# Altium footprint library lib_protel_HC_BOINA.PCBLIB: 726 footprints (part 33 of 46)
Each footprint in its own frame and in the unit in brackets; x right, y up, seen from the top. Pads: shape width x height; smd on the part's side, far side on the other; paste and mask are expansions set on the pad; w line width, h text height; cw(c..) or ccw(c..) is an arc to the next point about the centre after c.
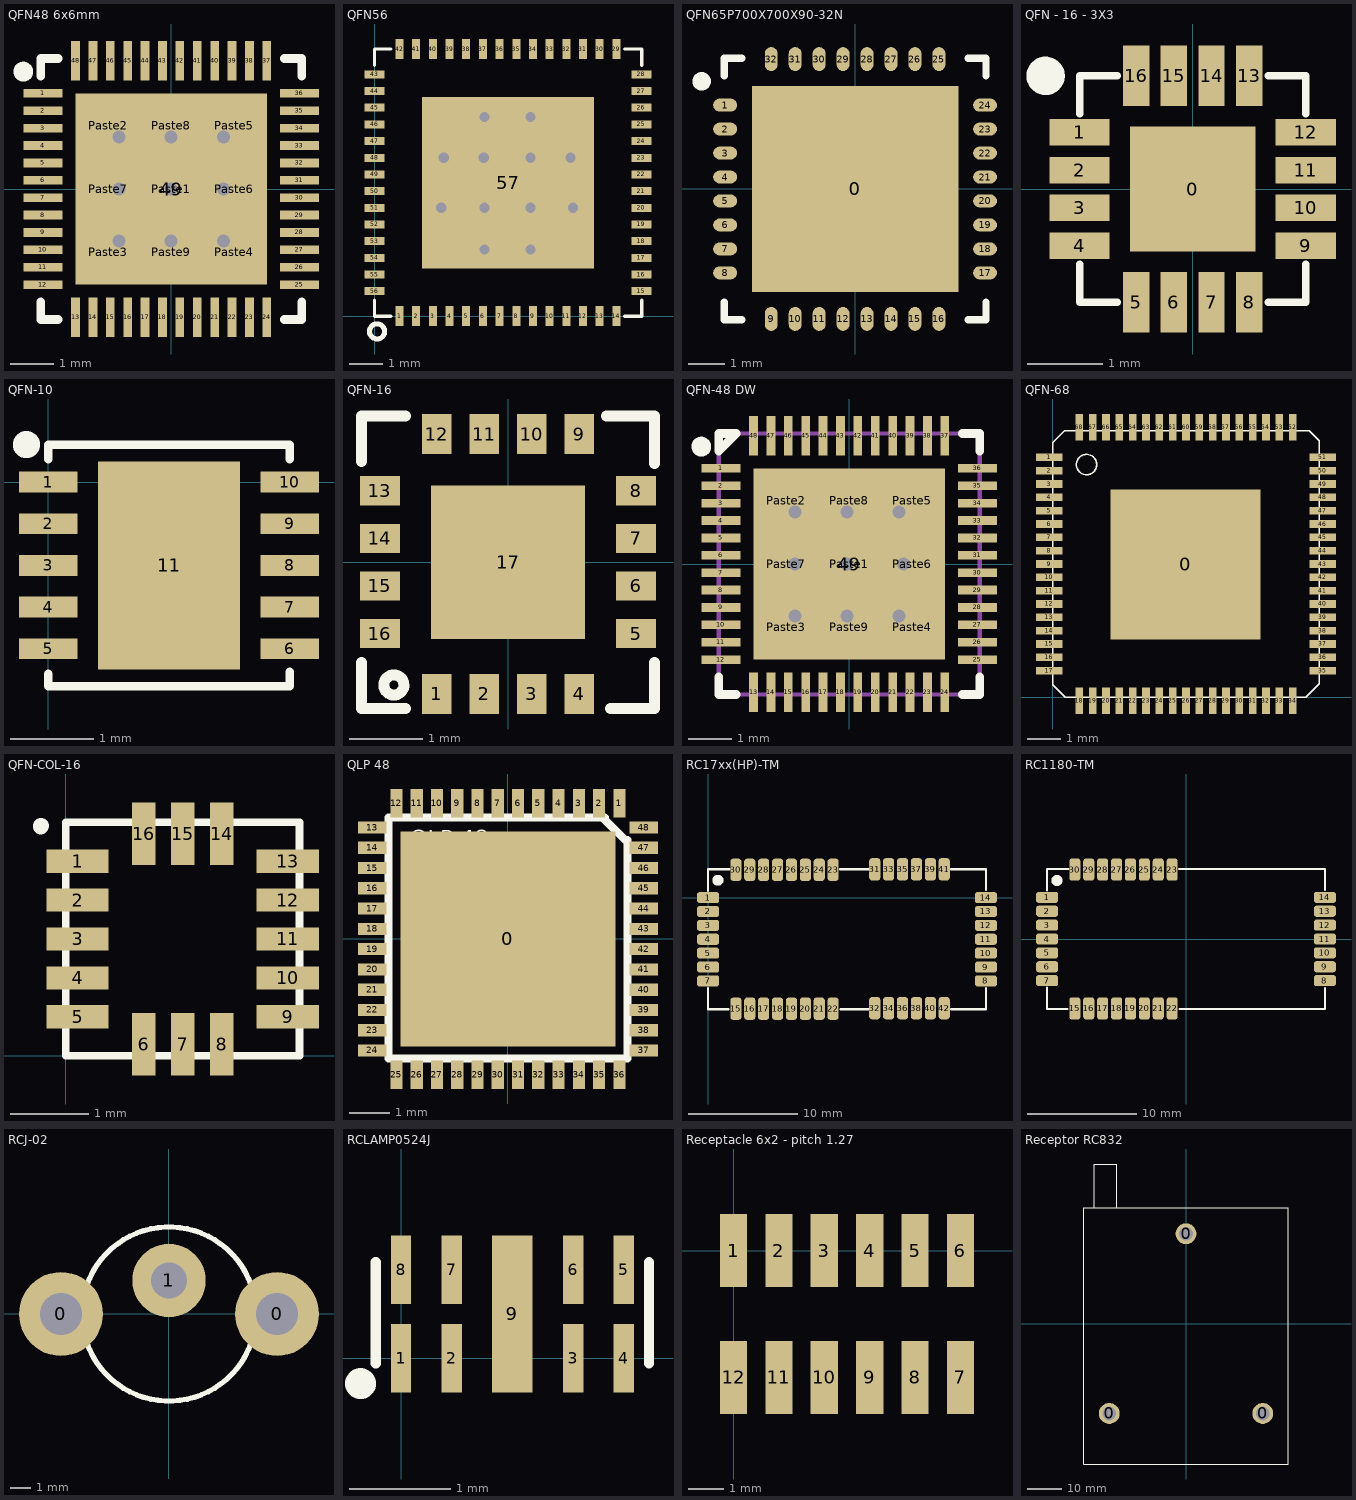
[diagram p32: the footprints below, top view; thin cyan lines are the x and y axes]

## QFN48 6x6mm [mm]
pads (58):
  rect 0.9x0.2 smd mask+0.05: 1(-2.95,2.2) 2(-2.95,1.8) 3(-2.95,1.4) 4(-2.95,1) 5(-2.95,0.6) 6(-2.95,0.2) 7(-2.95,-0.2) 8(-2.95,-0.6) 9(-2.95,-1) 10(-2.95,-1.4) 11(-2.95,-1.8) 12(-2.95,-2.2) 25(2.95,-2.2) 26(2.95,-1.8) 27(2.95,-1.4) 28(2.95,-1) 29(2.95,-0.6) 30(2.95,-0.2) 31(2.95,0.2) 32(2.95,0.6) 33(2.95,1) 34(2.95,1.4) 35(2.95,1.8) 36(2.95,2.2)
  rect 0.2x0.9 smd mask+0.05: 13(-2.2,-2.95) 14(-1.8,-2.95) 15(-1.4,-2.95) 16(-1,-2.95) 17(-0.6,-2.95) 18(-0.2,-2.95) 19(0.2,-2.95) 20(0.6,-2.95) 21(1,-2.95) 22(1.4,-2.95) 23(1.8,-2.95) 24(2.2,-2.95) 37(2.2,2.95) 38(1.8,2.95) 39(1.4,2.95) 40(1,2.95) 41(0.6,2.95) 42(0.2,2.95) 43(-0.2,2.95) 44(-0.6,2.95) 45(-1,2.95) 46(-1.4,2.95) 47(-1.8,2.95) 48(-2.2,2.95)
  rect 4.4x4.4 smd paste-4.4 mask+0.05: 49(0,0)
  rect 1.3x1.3 on Top Paste mask+0.05: Paste1(0,0) Paste2(-1.45,1.45) Paste3(-1.45,-1.45) Paste4(1.45,-1.45) Paste5(1.45,1.45) Paste6(1.45,0) Paste7(-1.45,0) Paste8(0,1.45) Paste9(0,-1.45)
via 1.2,1.2 diameter 0.6 hole 0.3
via -1.2,1.2 diameter 0.6 hole 0.3
via 1.2,-1.2 diameter 0.6 hole 0.3
via 0,-1.2 diameter 0.6 hole 0.3
via -1.2,-1.2 diameter 0.6 hole 0.3
via -1.2,0 diameter 0.6 hole 0.3
via 1.2,0 diameter 0.6 hole 0.3
via 0,0 diameter 0.6 hole 0.3
via 0,1.2 diameter 0.6 hole 0.3
Top Overlay:
  circle w0.254: c-3.4,2.7 r0.1
  lines w0.2: -3,-2.6 -3,-3 -2.6,-3 ; -3,2.6 -3,3 -2.6,3 ; 2.6,-3 3,-3 3,-2.6 ; 2.6,3 3,3 3,2.6
3D body: height 1, standoff 0, extent -3,-3 3,3

## QFN56 [mm] "encapsulado para SN75DP122ARTQ"
height 1
pads (57):
  rect 0.24x0.6 smd: 1(0.748,0) 2(1.248,0) 3(1.748,0) 4(2.248,0) 5(2.748,0) 6(3.248,0) 7(3.748,0) 8(4.248,0) 9(4.748,0) 10(5.248,0) 11(5.748,0) 12(6.248,0) 13(6.748,0) 14(7.248,0) 29(7.248,8.01) 30(6.748,8.01) 31(6.248,8.01) 32(5.748,8.01) 33(5.248,8.01) 34(4.748,8.01) 35(4.248,8.01) 36(3.748,8.01) 37(3.248,8.01) 38(2.748,8.01) 39(2.248,8.01) 40(1.748,8.01) 41(1.248,8.01) 42(0.748,8.01)
  rect 0.6x0.24 smd: 15(8,0.75) 16(8,1.25) 17(8,1.75) 18(8,2.25) 19(8,2.75) 20(8,3.25) 21(8,3.75) 22(8,4.25) 23(8,4.75) 24(8,5.25) 25(8,5.75) 26(8,6.25) 27(8,6.75) 28(8,7.25) 43(0,7.25) 44(0,6.75) 45(0,6.25) 46(0,5.75) 47(0,5.25) 48(0,4.75) 49(0,4.25) 50(0,3.75) 51(0,3.25) 52(0,2.75) 53(0,2.25) 54(0,1.75) 55(0,1.25) 56(0,0.75)
  rect 5.15x5.15 smd: 57(4,4)
via 2,3.25 diameter 0.61 hole 0.305
via 3.3,3.25 diameter 0.61 hole 0.305
via 4.675,3.25 diameter 0.61 hole 0.305
via 5.95,3.25 diameter 0.61 hole 0.305
via 4.675,2 diameter 0.61 hole 0.305
via 3.3,2 diameter 0.61 hole 0.305
via 3.275,4.75 diameter 0.61 hole 0.305
via 2.075,4.75 diameter 0.61 hole 0.305
via 4.675,4.75 diameter 0.61 hole 0.305
via 5.875,4.75 diameter 0.61 hole 0.305
via 3.3,5.975 diameter 0.61 hole 0.305
via 4.675,5.975 diameter 0.61 hole 0.305
Top Overlay:
  circle w0.152: c0.076,-0.456 r0.227
  lines w0.1: 0,0.483 0,0 0.482,0 ; 0,7.528 0,8.01 0.482,8.01 ; 7.502,0 8.01,0 8.01,0.483 ; 7.502,8.01 8.01,8.01 8.01,7.528

## QFN65P700X700X90-32N [mm] "QFN, 32-Leads, Body 7.1x7.1mm (max), Pitch 0.65mm, IPC Medium Density"
height 0.9
pads (33):
  rect 5.6x5.6 smd: 0(0,0)
  oval 0.65x0.35 smd: 1(-3.525,2.275) 2(-3.525,1.625) 3(-3.525,0.975) 4(-3.525,0.325) 5(-3.525,-0.325) 6(-3.525,-0.975) 7(-3.525,-1.625) 8(-3.525,-2.275) 17(3.525,-2.275) 18(3.525,-1.625) 19(3.525,-0.975) 20(3.525,-0.325) 21(3.525,0.325) 22(3.525,0.975) 23(3.525,1.625) 24(3.525,2.275)
  oval 0.35x0.65 smd: 9(-2.275,-3.525) 10(-1.625,-3.525) 11(-0.975,-3.525) 12(-0.325,-3.525) 13(0.325,-3.525) 14(0.975,-3.525) 15(1.625,-3.525) 16(2.275,-3.525) 25(2.275,3.525) 26(1.625,3.525) 27(0.975,3.525) 28(0.325,3.525) 29(-0.325,3.525) 30(-0.975,3.525) 31(-1.625,3.525) 32(-2.275,3.525)
Top Overlay:
  circle w0.25: c-4.164,2.921 r0.125
  lines w0.2: -3.55,-3.075 -3.55,-3.55 -3.075,-3.55 ; -3.55,3.075 -3.55,3.55 -3.075,3.55 ; 3.075,-3.55 3.55,-3.55 3.55,-3.075 ; 3.075,3.55 3.55,3.55 3.55,3.075

## QFN - 16 - 3X3 [mm]
height 1
pads (17):
  rect 1.66x1.66 smd mask+0.05: 0(0,0)
  rect 0.8x0.35 smd mask+0.05: 1(-1.5,0.75) 2(-1.5,0.25) 3(-1.5,-0.25) 4(-1.5,-0.75) 9(1.5,-0.75) 10(1.5,-0.25) 11(1.5,0.25) 12(1.5,0.75)
  rect 0.35x0.8 smd mask+0.05: 5(-0.75,-1.5) 6(-0.25,-1.5) 7(0.25,-1.5) 8(0.75,-1.5) 13(0.75,1.5) 14(0.25,1.5) 15(-0.25,1.5) 16(-0.75,1.5)
Top Overlay:
  circle w0.254: c-1.95,1.5 r0.127
  lines w0.1: -1.5,-1 -1.5,-1.5 -1,-1.5 ; -1.5,1 -1.5,1.5 -1,1.5 ; 1,-1.5 1.5,-1.5 1.5,-1 ; 1,1.5 1.5,1.5 1.5,1
3D body "User Library-QFN-16_3x3.STEP": height 0.9, standoff 0, extent -1.521,-1.5 1.521,1.542

## QFN-10 [mm] "MP2109"
height 1
pads (11):
  rect 0.7x0.25 smd: 1(0,0) 2(0,-0.5) 3(0,-1) 4(0,-1.5) 5(0,-2) 6(2.9,-2) 7(2.9,-1.5) 8(2.9,-1) 9(2.9,-0.5) 10(2.9,0)
  rect 1.7x2.5 smd: 11(1.45,-1)
Top Overlay:
  circle w0.254: c-0.26,0.45 r0.035
  lines w0.1: 0,-2.3 0,-2.45 2.9,-2.45 2.9,-2.275 ; 0,0.275 0,0.45 2.9,0.45 2.9,0.275
3D body: height 1, standoff 0.1, extent 0,-2.45 2.9,0.45

## QFN-16 [mm] "ACCELER_MMA7260"
height 1.45
pads (17):
  rect 0.4x0.55 smd mask+0.1: 1(-0.975,-1.8) 2(-0.325,-1.8) 3(0.325,-1.8) 4(0.975,-1.8) 9(0.975,1.75) 10(0.325,1.75) 11(-0.325,1.75) 12(-0.975,1.75)
  rect 0.55x0.4 smd mask+0.1: 5(1.75,-0.975) 6(1.75,-0.325) 7(1.75,0.325) 8(1.75,0.975) 13(-1.75,0.975) 14(-1.75,0.325) 15(-1.75,-0.325) 16(-1.75,-0.975)
  rect 2.1x2.1 smd mask+0.05: 17(0,0)
Top Overlay:
  lines w0.15: -1.425,-1.65 ccw(c-1.56,-1.678) -1.422,-1.678
  lines w0.152: -2,-1.375 -2,-2 -1.4,-2 ; -2,1.375 -2,2 -1.4,2 ; 1.35,2 2,2 ; 1.4,-2 2,-2 ; 2,-1.375 2,-2 ; 2,1.35 2,2 ; 2,-2 2,-2 ; 2,-2 2,-2 ; 2,2 2,2

## QFN-48 DW [mm] "DecaWave módulo QFN 48"
height 0.95
pads (58):
  rect 0.9x0.2 smd mask+0.05: 1(-2.95,2.2) 2(-2.95,1.8) 3(-2.95,1.4) 4(-2.95,1) 5(-2.95,0.6) 6(-2.95,0.2) 7(-2.95,-0.2) 8(-2.95,-0.6) 9(-2.95,-1) 10(-2.95,-1.4) 11(-2.95,-1.8) 12(-2.95,-2.2) 25(2.95,-2.2) 26(2.95,-1.8) 27(2.95,-1.4) 28(2.95,-1) 29(2.95,-0.6) 30(2.95,-0.2) 31(2.95,0.2) 32(2.95,0.6) 33(2.95,1) 34(2.95,1.4) 35(2.95,1.8) 36(2.95,2.2)
  rect 0.2x0.9 smd mask+0.05: 13(-2.2,-2.95) 14(-1.8,-2.95) 15(-1.4,-2.95) 16(-1,-2.95) 17(-0.6,-2.95) 18(-0.2,-2.95) 19(0.2,-2.95) 20(0.6,-2.95) 21(1,-2.95) 22(1.4,-2.95) 23(1.8,-2.95) 24(2.2,-2.95) 37(2.2,2.95) 38(1.8,2.95) 39(1.4,2.95) 40(1,2.95) 41(0.6,2.95) 42(0.2,2.95) 43(-0.2,2.95) 44(-0.6,2.95) 45(-1,2.95) 46(-1.4,2.95) 47(-1.8,2.95) 48(-2.2,2.95)
  rect 4.4x4.4 smd paste-4.4 mask+0.05: 49(0,0)
  rect 1.3x1.3 on Top Paste mask+0.05: Paste1(0,0) Paste2(-1.45,1.45) Paste3(-1.45,-1.45) Paste4(1.45,-1.45) Paste5(1.45,1.45) Paste6(1.45,0) Paste7(-1.45,0) Paste8(0,1.45) Paste9(0,-1.45)
via -0.05,1.2 diameter 0.6 hole 0.3
via -0.05,0 diameter 0.6 hole 0.3
via 1.25,0 diameter 0.6 hole 0.3
via -1.25,0 diameter 0.6 hole 0.3
via -1.25,-1.2 diameter 0.6 hole 0.3
via -0.05,-1.2 diameter 0.6 hole 0.3
via 1.15,-1.2 diameter 0.6 hole 0.3
via -1.25,1.2 diameter 0.6 hole 0.3
via 1.15,1.2 diameter 0.6 hole 0.3
Top Overlay:
  circle w0.254: c-3.4,2.7 r0.1
  lines w0.2: -3,-2.6 -3,-3 -2.6,-3 ; 2.6,-3 3,-3 3,-2.6 ; 2.6,3 3,3 3,2.6 ; -3,2.6 -3,3 -2.6,3 -3,2.6
Mechanical 13:
  lines w0.1: -3,-3 -3,3 3,3 3,-3 -3,-3
  text ".Designator" at -2.921,3.937 h0.8
3D body: height 1, standoff 0, extent -3,-3 3,3

## QFN-68 [mm] "QFN-68 CYPRESS PSOC"
height 0.9
pads (69):
  rect 4.5x4.5 smd mask+0.1: 0(3.988,3.988)
  rect 0.8x0.23 smd mask+0.1: 1(-0.102,7.2) 2(-0.102,6.8) 3(-0.102,6.4) 4(-0.102,6) 5(-0.102,5.6) 6(-0.102,5.2) 7(-0.102,4.8) 8(-0.102,4.4) 9(-0.102,4) 10(-0.102,3.6) 11(-0.102,3.2) 12(-0.102,2.8) 13(-0.102,2.4) 14(-0.102,2) 15(-0.102,1.6) 16(-0.102,1.2) 17(-0.102,0.8) 35(8.103,0.8) 36(8.103,1.2) 37(8.103,1.6) 38(8.103,2) 39(8.103,2.4) 40(8.103,2.8) 41(8.103,3.2) 42(8.103,3.6) 43(8.103,4) 44(8.103,4.4) 45(8.103,4.8) 46(8.103,5.2) 47(8.103,5.6) 48(8.103,6) 49(8.103,6.4) 50(8.103,6.8) 51(8.103,7.2)
  rect 0.23x0.8 smd mask+0.1: 18(0.801,-0.102) 19(1.201,-0.102) 20(1.601,-0.102) 21(2.001,-0.102) 22(2.401,-0.102) 23(2.801,-0.102) 24(3.201,-0.102) 25(3.601,-0.102) 26(4.001,-0.102) 27(4.401,-0.102) 28(4.801,-0.102) 29(5.201,-0.102) 30(5.601,-0.102) 31(6.001,-0.102) 32(6.401,-0.102) 33(6.801,-0.102) 34(7.201,-0.102) 52(7.201,8.103) 53(6.801,8.103) 54(6.401,8.103) 55(6.001,8.103) 56(5.601,8.103) 57(5.201,8.103) 58(4.801,8.103) 59(4.401,8.103) 60(4.001,8.103) 61(3.601,8.103) 62(3.201,8.103) 63(2.801,8.103) 64(2.401,8.103) 65(2.001,8.103) 66(1.601,8.103) 67(1.201,8.103) 68(0.801,8.103)
Top Overlay:
  circle w0.051: c1.015,6.985 r0.306
  lines w0.051: 0,0.381 0.381,0 7.595,0 8.001,0.406 8.001,7.696 7.696,8.001 0.356,8.001 0,7.645 0,0.381

## QFN-COL-16 [mm] "ACCELER_MMA8453Q"
height 1
pads (16):
  rect 0.8x0.3 smd mask+0.1: 1(0.15,2.5) 2(0.15,2) 3(0.15,1.5) 4(0.15,1) 5(0.15,0.5) 9(2.85,0.5) 10(2.85,1) 11(2.85,1.5) 12(2.85,2) 13(2.85,2.5)
  rect 0.3x0.8 smd mask+0.1: 6(1,0.15) 7(1.5,0.15) 8(2,0.15) 14(2,2.85) 15(1.5,2.85) 16(1,2.85)
Top Overlay:
  lines w0.1: 0,0 3,0 3,3 0,3 0,0
  lines w0.2: -0.32,2.94 ccw(c-0.46,2.955) -0.319,2.955

## QLP 48 [mm]
height 0.85
pads (49):
  rect 5.3x5.3 smd: 0(0,0)
  rect 0.3x0.7 smd: 1(2.75,3.35) 2(2.25,3.35) 3(1.75,3.35) 4(1.25,3.35) 5(0.75,3.35) 6(0.25,3.35) 7(-0.25,3.35) 8(-0.75,3.35) 9(-1.25,3.35) 10(-1.75,3.35) 11(-2.25,3.35) 12(-2.75,3.35) 25(-2.75,-3.35) 26(-2.25,-3.35) 27(-1.75,-3.35) 28(-1.25,-3.35) 29(-0.75,-3.35) 30(-0.25,-3.35) 31(0.25,-3.35) 32(0.75,-3.35) 33(1.25,-3.35) 34(1.75,-3.35) 35(2.25,-3.35) 36(2.75,-3.35)
  rect 0.7x0.3 smd: 13(-3.346,2.75) 14(-3.346,2.25) 15(-3.346,1.75) 16(-3.346,1.25) 17(-3.346,0.75) 18(-3.346,0.25) 19(-3.346,-0.25) 20(-3.346,-0.75) 21(-3.346,-1.25) 22(-3.346,-1.75) 23(-3.346,-2.25) 24(-3.346,-2.75) 37(3.35,-2.75) 38(3.35,-2.25) 39(3.35,-1.75) 40(3.35,-1.25) 41(3.35,-0.75) 42(3.35,-0.25) 43(3.35,0.25) 44(3.35,0.75) 45(3.35,1.25) 46(3.35,1.75) 47(3.35,2.25) 48(3.35,2.75)
Top Overlay:
  circle w0.1: c2.187,2.184 r0.353
  lines w0.2: 2.337,2.997 2.946,2.388 ; 2.388,2.997 -2.946,2.997 -2.946,-2.946 2.946,-2.946 2.946,2.438
  text "QLP 48" at -2.413,2.286 h0.4

## RC17xx(HP)-TM [mil] "Modulo Radiocraft 41 pines"
pads (42):
  rrect50% 80x40 smd: 1(0,0) 2(0,-50) 3(0,-100) 4(0,-150) 5(0,-200) 6(0,-250) 7(0,-300) 8(1000,-300) 9(1000,-250) 10(1000,-200) 11(1000,-150) 12(1000,-100) 13(1000,-50) 14(1000,0)
  rrect50% 40x80 smd: 15(100,-400) 16(150,-400) 17(200,-400) 18(250,-400) 19(300,-400) 20(350,-400) 21(400,-400) 22(450,-400) 23(450,100) 24(400,100) 25(350,100) 26(300,100) 27(250,100) 28(200,100) 29(150,100) 30(100,100) 31(600,101.97) 32(600,-398.03) 33(650,101.97) 34(650,-398.03) 35(700,101.97) 36(700,-398.03) 37(750,101.97) 38(750,-398.03) 39(800,101.97) 40(800,-398.03) 41(850,101.97) 42(850,-398.03)
Top Overlay:
  circle w19.68: c35.43,62.6 r9.84
  lines w7.87: 0,-325.2 0,-401.97 73.82,-401.97 ; 0,24.21 0,101.97 75.79,101.97 ; 475.39,101.97 576.77,101.97 ; 477.36,-401.97 576.77,-401.97 ; 874.02,-401.97 1000,-401.97 1000,-326.18 ; 874.02,101.97 1000,101.97 1000,27.17

## RC1180-TM [mil] "Modulo TinyMesh de Radiocraft"
height 129.92
pads (30):
  rrect50% 80x40 smd: 1(-500,150) 2(-500,100) 3(-500,50) 4(-500,0) 5(-500,-50) 6(-500,-100) 7(-500,-150) 8(500,-150) 9(500,-100) 10(500,-50) 11(500,0) 12(500,50) 13(500,100) 14(500,150)
  rrect50% 40x80 smd: 15(-400,-250) 16(-350,-250) 17(-300,-250) 18(-250,-250) 19(-200,-250) 20(-150,-250) 21(-100,-250) 22(-50,-250) 23(-50,250) 24(-100,250) 25(-150,250) 26(-200,250) 27(-250,250) 28(-300,250) 29(-350,250) 30(-400,250)
Top Overlay:
  circle w19.68: c-464.57,210.63 r9.84
  lines w7.87: -500,-175.2 -500,-251.97 -426.18,-251.97 ; -500,174.21 -500,251.97 -424.21,251.97 ; -24.61,251.97 500,251.97 500,177.17 ; -22.64,-251.97 500,-251.97 500,-176.18

## RCJ-02 [mm]
pads (3):
  round 4 hole 2: 0(-5.15,0) 0(5.15,0)
  round 3.5 hole 1.7: 1(0,1.6)
Top Overlay:
  circle w0.254: c0,0 r4.15

## RCLAMP0524J [mm] "ARRAY TVS"
height 0.5
pads (9):
  rect 0.2x0.675 smd: 1(0,0) 2(0.5,0) 3(1.7,0) 4(2.2,0) 5(2.2,0.875) 6(1.7,0.875) 7(0.5,0.875) 8(0,0.875)
  rect 0.4x1.55 smd: 9(1.1,0.437)
Top Overlay:
  circle w0.254: c-0.4,-0.25 r0.025
  lines w0.1: -0.25,-0.05 -0.25,0.95 ; 2.45,-0.05 2.45,0.95

## Receptacle 6x2 - pitch 1.27 [mm] "Female receptacle 6x2 - pitch 1.27 (20021321-00012C4LF)"
pads (12):
  rect 0.76x2.05 smd: 1(0,0) 2(1.27,0) 3(2.54,0) 4(3.81,0) 5(5.08,0) 6(6.35,0) 7(6.35,-3.55) 8(5.08,-3.55) 9(3.81,-3.55) 10(2.54,-3.55) 11(1.27,-3.55) 12(0,-3.55)

## Receptor RC832 [mm]
pads (3):
  round 6 hole 4: 0(-22,-25.75) 0(0,25.75) 0(22,-25.75)
Top Overlay:
  lines w0.3: -26.25,33.25 -26.25,45.75 -19.9,45.75 -19.9,33.25 ; -29.25,-40.25 -29.25,33.25 29.25,33.25 29.25,-40.25 -29.25,-40.25